# Altium footprint library Footprints.PcbLib: 207 footprints (part 10 of 13)
Each footprint in its own frame and in the unit in brackets; x right, y up, seen from the top. Pads: shape width x height; smd on the part's side, far side on the other; paste and mask are expansions set on the pad; w line width, h text height; cw(c..) or ccw(c..) is an arc to the next point about the centre after c.
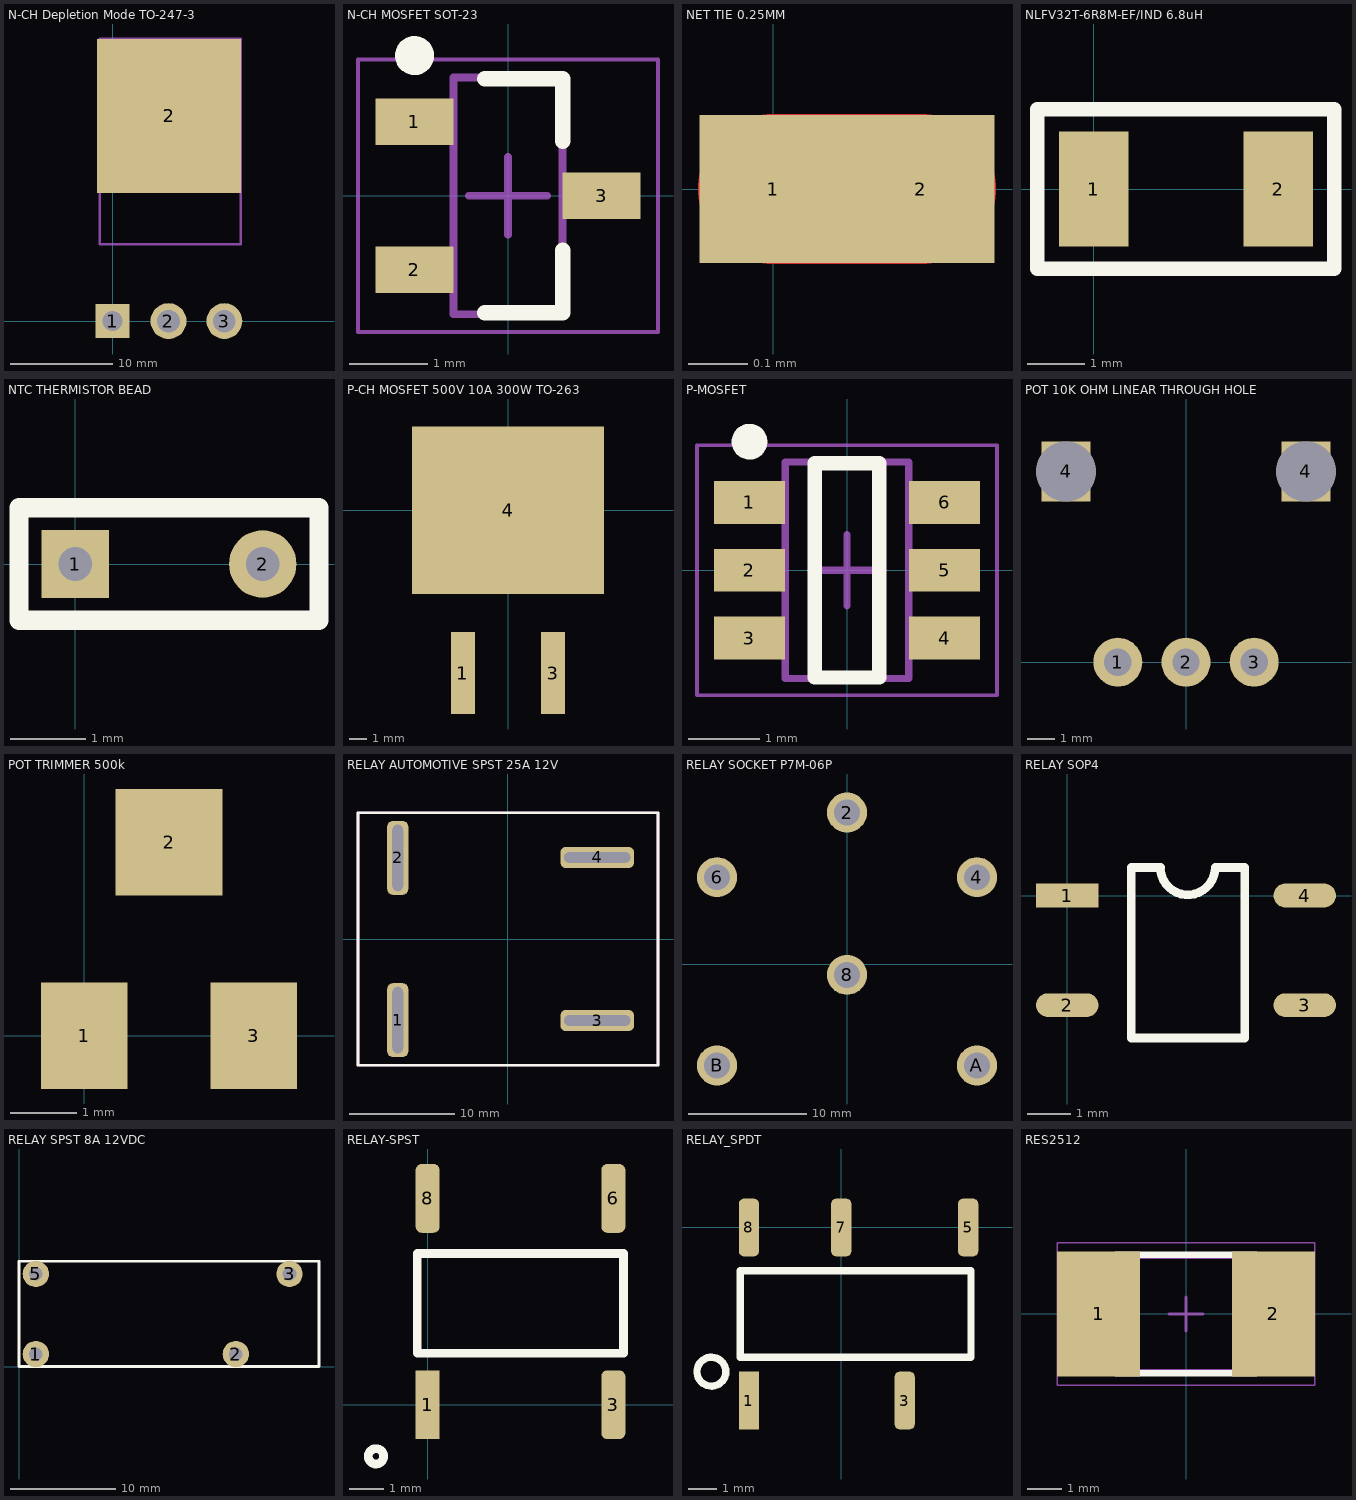
[diagram p9: the footprints below, top view; thin cyan lines are the x and y axes]

## N-CH Depletion Mode TO-247-3 [mm]
pads (4):
  rect 3.3x3.3 hole 1.95: 1(0,0)
  round 3.5 hole 2.2: 2(5.45,0) 3(10.9,0)
  rect 14x15 smd: 2(5.5,20)
Mechanical 1:
  lines w0.254: -1.25,7.5 -1.25,27.5 12.5,27.5 12.5,7.5 -1.25,7.5
3D body: height 33.5, standoff -5.5, extent 10.88,0 10.88,0
3D body: height 30.47, standoff -5.5, extent 10.88,0 10.88,0
3D body "TO-247AC-HB.stp": height 5.3, standoff -4.3, extent -2.5,-0.5 13.35,28.285

## N-CH MOSFET SOT-23 [mm] "SI2318CDS-T1-GE3CT-ND"
height 1.12
pads (3):
  rect 1x0.6 smd: 1(-1.2,0.95) 2(-1.2,-0.95) 3(1.2,0)
Top Overlay:
  circle w0.25: c-1.2,1.8 r0.125
  lines w0.2: -0.3,-1.5 0.7,-1.5 0.7,-0.7 ; -0.3,1.5 0.7,1.5 0.7,0.7
Mechanical 13:
  lines w0.1: -0.7,-1.52 0.7,-1.52 0.7,1.52 -0.7,1.52 -0.7,-1.52
Mechanical 15:
  lines w0.05: -1.925,-1.75 1.925,-1.75 1.925,1.75 -1.925,1.75 -1.925,-1.75
  lines w0.1: -0.5,0 0.5,0 ; 0,-0.5 0,0.5
3D body: height 1.12, standoff 0.1, extent -0.7,-1.52 0.7,1.52

## NET TIE 0.25MM [mm]
pads (2):
  rect 0.25x0.25 smd mask+0: 1(0,0) 2(0.25,0)
Top Layer:
  lines w0.254: 0,0 0.25,0

## NLFV32T-6R8M-EF/IND 6.8uH [mm]
pads (2):
  rect 1.2x2 smd: 1(0,0) 2(3.2,0)
Top Overlay:
  lines w0.254: -0.98,-1.38 -0.98,1.38 4.17,1.38 4.17,-1.38 -0.98,-1.38
3D body: height 2.2, standoff 0, extent -0.979,-1.379 4.169,1.379

## NTC THERMISTOR BEAD [mm] "NTC Thermistor 10k Bead"
pads (2):
  rect 0.9x0.9 hole 0.45: 1(0,0)
  round 0.9 hole 0.45: 2(2.5,0)
Top Overlay:
  lines w0.254: -0.75,-0.75 3.25,-0.75 3.25,0.75 -0.75,0.75 -0.75,-0.75

## P-CH MOSFET 500V 10A 300W TO-263 [mm]
pads (3):
  rect 1.35x4.6 smd: 1(-2.54,-9.15) 3(2.54,-9.15)
  rect 10.8x9.4 smd: 4(0,0)
3D body "to-263.STEP": height 4.3, standoff 0, extent -5,-11.19 5,4.69

## P-MOSFET [mm] "SOT23, 6-Leads, Body 2.93x2.80mm, Pitch 0.95mm, IPC Medium Density"
height 1.25
pads (6):
  rect 1x0.6 smd mask+0.076: 1(-1.365,0.95) 2(-1.365,0) 3(-1.365,-0.95) 4(1.365,-0.95) 5(1.365,0) 6(1.365,0.95)
Top Overlay:
  circle w0.25: c-1.365,1.8 r0.125
  lines w0.2: -0.45,-1.5 -0.45,1.5 0.45,1.5 0.45,-1.5 -0.45,-1.5
Mechanical 13:
  lines w0.1: -0.865,-1.515 0.865,-1.515 0.865,1.515 -0.865,1.515 -0.865,-1.515
Mechanical 15:
  lines w0.05: -2.1,-1.75 2.1,-1.75 2.1,1.75 -2.1,1.75 -2.1,-1.75
  lines w0.1: -0.5,0 0.5,0 ; 0,-0.5 0,0.5
3D body "P-MOSFET.step": height 1.25, standoff 0, extent -1.5,-1.515 1.5,1.515

## POT 10K OHM LINEAR THROUGH HOLE [mm]
pads (5):
  round 1.8 hole 1: 1(-2.5,0) 2(0,0) 3(2.5,0)
  rect 1.8x2.2 hole 2.2 square: 4(-4.4,7) 4(4.4,7)
3D body "ptv09a-4x15f-xxxx.stp": height 13.5, standoff -5.49, extent -5.7,-0.15 5.7,12.5

## POT TRIMMER 500k [mm] "TRIMMER 500K OHM 0.25W SMD"
pads (3):
  rect 1.3x1.6 smd mask+0.076: 1(0,0)
  rect 1.6x1.6 smd: 2(1.27,2.9)
  rect 1.3x1.6 smd: 3(2.54,0)
3D body "SM-42TW500k_(504).stp": height 5.3, standoff 0, extent -1.13,-0.45 3.67,3.45
3D body: height 0.25, standoff 0, extent 0,2.54 0,2.54

## RELAY AUTOMOTIVE SPST 25A 12V [mm]
pads (4):
  rrect50% 2x7 hole 6.3 slot 1 at 0 deg: 1(-10.45,-7.7) 2(-10.45,7.7)
  rrect50% 7x2 hole 6.3 slot 1 at 90 deg: 3(8.5,-7.75) 4(8.5,7.75)
Top Overlay:
  lines w0.254: -14.225,-5.566 -14.225,-11.998 ; -14.225,-5.49 -14.225,4.51 ; -14.225,4.434 -14.225,12 -13.671,12 14.2,12 ; 14.275,-5.566 14.276,12 ; -14.225,-11.998 -14.224,-11.999 -14.225,-11.998 ; -14.224,-12 14.276,-12 14.276,-5.566 ; -14.224,-12 -14.224,-12 ; -14.224,-12 -14.224,-12 ; 14.2,12 14.2,12 ; 14.2,12 14.2,12 ; 14.275,-5.566 14.276,-5.566 ; 14.275,-5.566 14.276,-5.566
Mechanical 15:
  lines w0.254: -14.225,-11.998 -14.225,-5.566 ; -14.225,-5.49 -14.225,4.51 ; -14.224,-12 14.276,-12 14.276,-5.566 ; -14.225,4.434 -14.225,12 -13.671,12 14.2,12 ; 14.275,-5.566 14.276,12

## RELAY SOCKET P7M-06P [mm]
pads (6):
  round 3.4 hole 2.2: 2(0,12.9) 4(11.05,7.4) 6(-11.05,7.4) 8(0,-0.9) A(11.05,-8.6) B(-11.05,-8.6)
3D body: height 64, standoff 0, extent -19.5,-21.5 19.5,21.5

## RELAY SOP4 [mm]
pads (4):
  rect 1.45x0.55 smd: 1(0,0)
  oval 1.45x0.55 smd: 2(0,-2.54) 3(5.5,-2.54) 4(5.5,0)
Top Overlay:
  lines w0.2: 2.155,0.65 ccw(c2.79,0.65) 3.425,0.65 ; 2.165,0.65 1.485,0.65 1.485,-3.3 4.115,-3.3 4.115,0.65 3.475,0.65
3D body "User Library-SOP-4.step": height 2.02, standoff -0.02, extent -0.73,-3.3 6.13,0.7

## RELAY SPST 8A 12VDC [mm]
pads (4):
  round 2.5 hole 1.3: 1(1.6,1.19) 2(20.6,1.19) 3(25.7,8.81) 5(1.6,8.81)
Top Overlay:
  lines w0.254: 0,0.01 28.5,0.01 28.5,10.01 0,10.01 0,0.01
3D body "G6RN_1A.x_t": height 15, standoff -3.5, extent 0,0.01 28.5,10.01

## RELAY-SPST [mm]
pads (4):
  rect 0.7x2 smd: 1(0,0)
  rrect50% 0.7x2 smd: 3(5.4,0) 6(5.4,6) 8(0,6)
Top Overlay:
  circle w0.254: c-1.5,-1.5 r0.224
  lines w0.254: -0.3,1.5 5.7,1.5 5.7,4.4 -0.3,4.4 -0.3,1.5
3D body: height 5.65, standoff 0, extent -0.299,1.501 5.699,4.399

## RELAY_SPDT [mm]
pads (5):
  rect 0.7x2 smd: 1(-3.2,-6)
  rrect50% 0.7x2 smd: 3(2.2,-6) 5(4.4,0) 7(0,0) 8(-3.2,0)
Top Overlay:
  circle w0.254: c-4.5,-5 r0.5
  lines w0.254: -3.5,-4.5 -3.5,-3.75 -3.5,-2.25 -3.5,-1.5 4.5,-1.5 4.5,-4.5 -3.5,-4.5
3D body: height 5.65, standoff 0, extent -3.499,-4.499 4.499,-1.501

## RES2512 [mm]
height 0.65
pads (2):
  rect 2.45x3.7 smd: 1(-2.575,0) 2(2.575,0)
Top Overlay:
  lines w0.2: -2.05,-1.75 2.05,-1.75 ; -2.05,1.75 2.05,1.75
Mechanical 13:
  lines w0.1: -3.175,-1.675 3.175,-1.675 3.175,1.675 -3.175,1.675 -3.175,-1.675
Mechanical 15:
  lines w0.05: -3.8,-2.1 3.8,-2.1 3.8,2.1 -3.8,2.1 -3.8,-2.1
  lines w0.1: -0.5,0 0.5,0 ; 0,-0.5 0,0.5
3D body "RES2512.step": height 0.65, standoff 0, extent -3.175,-1.675 3.175,1.675